# Altium footprint library Relays.PcbLib: 113 footprints (part 1 of 8)
Each footprint in its own frame and in the unit in brackets; x right, y up, seen from the top. Pads: shape width x height; smd on the part's side, far side on the other; paste and mask are expansions set on the pad; w line width, h text height; cw(c..) or ccw(c..) is an arc to the next point about the centre after c.
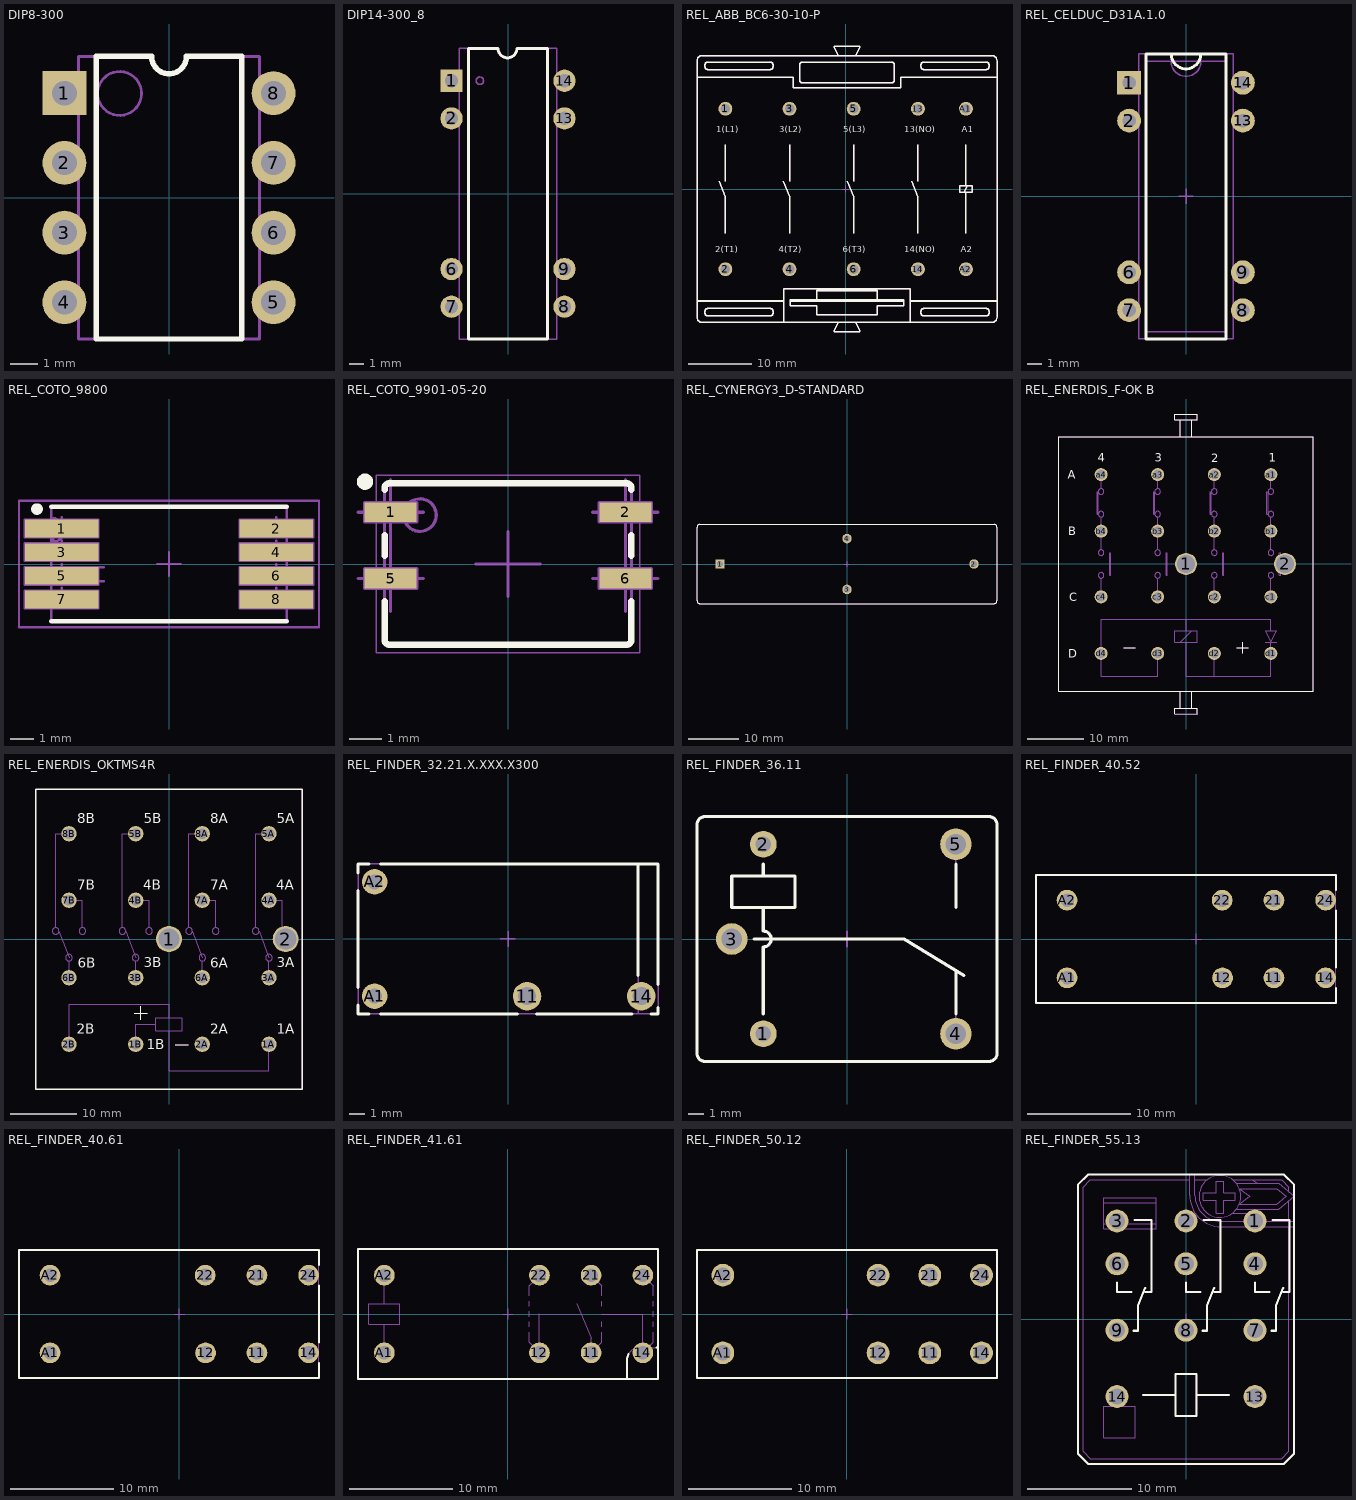
[diagram p0: the footprints below, top view; thin cyan lines are the x and y axes]

## DIP8-300 [mm] "DIP 8 Leads, Row Spacing 7.62 mm; Pitch 2.54 mm"
height 5.08
pads (8):
  rect 1.6x1.6 hole 0.9: 1(-3.81,3.81)
  round 1.6 hole 0.9: 2(-3.81,1.27) 3(-3.81,-1.27) 4(-3.81,-3.81) 5(3.81,-3.81) 6(3.81,-1.27) 7(3.81,1.27) 8(3.81,3.81)
Top Overlay:
  lines w0.2: -2.65,-5.15 2.65,-5.15 2.65,5.15 0.635,5.15 cw(c0,5.15) -0.635,5.15 -2.65,5.15 -2.65,-5.15
Mechanical 14:
  circle w0.1: c-1.8,3.8 r0.8
  lines w0.1: -3.3,-5.15 -3.3,5.15 -0.67,5.15 ccw(c-0.035,5.15) 0.6,5.15 3.3,5.15 3.3,-5.15 -3.3,-5.15
3D body "DIP8-300.stp": height 5.33, standoff -3.3, extent -3.91,-5.03 3.96,5.13

## DIP14-300_8 [mm] "DIP 14 Leads, Row Spacing 7.62 mm; Pitch 2.54 mm"
height 5.08
pads (8):
  rect 1.5x1.5 hole 0.9: 1(-3.81,7.62)
  round 1.5 hole 0.9: 2(-3.81,5.08) 6(-3.81,-5.08) 7(-3.81,-7.62) 8(3.81,-7.62) 9(3.81,-5.08) 13(3.81,5.08) 14(3.81,7.62)
Top Overlay:
  lines w0.2: -0.685,9.8 -2.65,9.8 -2.65,-9.8 2.65,-9.8 2.65,9.8 ; -0.67,9.8 ccw(c-0.035,9.8) 0.6,9.8 2.615,9.8
Mechanical 14:
  circle w0.1: c-1.905,7.62 r0.254
  lines w0.1: -3.3,-9.8 3.3,-9.8 3.3,9.8 0.6,9.8 cw(c-0.035,9.8) -0.67,9.8 -3.3,9.8 -3.3,-9.8
3D body "DIP14-300.stp": height 5.33, standoff -3.3, extent -3.935,-9.845 3.935,9.845

## REL_ABB_BC6-30-10-P [mm] "10 Leads, Body 47.5mm x 45.2mm, ABB BC6 3-pole Contactor"
height 47.7
pads (10):
  round 2.2 hole 1.5: 1(-19.04,12.7) 2(-19.04,-12.7) 3(-8.88,12.7) 4(-8.88,-12.7) 5(1.28,12.7) 6(1.28,-12.7) 13(11.44,12.7) 14(11.44,-12.7) A1(19.04,12.7) A2(19.04,-12.7)
Top Overlay:
  lines w0.2: -23.53,-17.811 -9.78,-17.811 ; -23.53,-17.7 -9.78,-17.7 ; -23.53,17.7 -8.28,17.7 -8.28,16 8.72,16 8.72,17.7 23.97,17.7 ; -20.04,1.25 -19.04,-1.25 -19.04,-7 ; -19.04,1.25 -19.04,7 ; -9.88,1.25 -8.88,-1.25 -8.88,-7 ; -9.78,-21.1 -9.78,-15.8 10.22,-15.8 10.22,-21.1 ; -8.88,1.25 -8.88,7 ; -8.78,-17.811 9.22,-17.811 ; -8.78,-17.529 9.22,-17.529 ; -4.58,-16.107 5.02,-16.107 ; -1.28,-21.1 -1.28,-21.3 -1.78,-22.4 -1.78,-22.6 2.22,-22.6 2.22,-22.4 1.72,-21.3 1.72,-21.1 ; -1.28,21.1 -1.28,21.3 -1.78,22.4 -1.78,22.6 2.22,22.6 2.22,22.4 1.72,21.3 1.72,21.1 ; 0.28,1.25 1.28,-1.25 1.28,-7 ; 1.28,1.25 1.28,7 ; 10.22,-17.811 23.97,-17.811 ; 10.22,-17.7 23.97,-17.7 ; 10.44,1.25 11.44,-1.25 11.44,-7 ; 11.44,1.25 11.44,7 ; 18.79,-0.5 19.29,0.5 ; 19.04,-7 19.04,-0.5 ; 19.04,0.5 19.04,7 ; -23.53,-20.3 ccw(c-22.73,-20.3) -22.73,-21.1 23.17,-21.1 ccw(c23.17,-20.3) 23.97,-20.3 23.97,20.3 ccw(c23.17,20.3) 23.17,21.1 -22.73,21.1 ccw(c-22.73,20.3) -23.53,20.3 -23.53,-20.3 ; -22.28,-19.6 ccw(c-21.78,-19.6) -21.78,-20.1 -11.98,-20.1 ccw(c-11.98,-19.6) -11.48,-19.6 -11.48,-19.4 ccw(c-11.98,-19.4) -11.98,-18.9 -21.78,-18.9 ccw(c-21.78,-19.4) -22.28,-19.4 -22.28,-19.6 ; -22.28,19.4 ccw(c-21.78,19.4) -21.78,18.9 -11.98,18.9 ccw(c-11.98,19.4) -11.48,19.4 -11.48,19.6 ccw(c-11.98,19.6) -11.98,20.1 -21.78,20.1 ccw(c-21.78,19.6) -22.28,19.6 -22.28,19.4 ; -8.78,-18.5 -8.78,-17.5 -4.58,-17.5 -4.58,-16 5.02,-16 5.02,-17.5 9.22,-17.5 9.22,-18.5 5.02,-18.5 5.02,-19.9 -4.58,-19.9 -4.58,-18.5 -8.78,-18.5 ; -7.28,17.3 ccw(c-6.78,17.3) -6.78,16.8 7.22,16.8 ccw(c7.22,17.3) 7.72,17.3 7.72,19.6 ccw(c7.22,19.6) 7.22,20.1 -6.78,20.1 ccw(c-6.78,19.6) -7.28,19.6 -7.28,17.3 ; 11.92,-19.6 ccw(c12.42,-19.6) 12.42,-20.1 22.22,-20.1 ccw(c22.22,-19.6) 22.72,-19.6 22.72,-19.4 ccw(c22.22,-19.4) 22.22,-18.9 12.42,-18.9 ccw(c12.42,-19.4) 11.92,-19.4 11.92,-19.6 ; 11.92,19.4 ccw(c12.42,19.4) 12.42,18.9 22.22,18.9 ccw(c22.22,19.4) 22.72,19.4 22.72,19.6 ccw(c22.22,19.6) 22.22,20.1 12.42,20.1 ccw(c12.42,19.6) 11.92,19.6 11.92,19.4 ; 18.04,-0.5 18.04,0.5 20.04,0.5 20.04,-0.5 18.04,-0.5
  text "6(T3)" at -0.45,-10 h1
  text "4(T2)" at -10.6,-10 h1
  text "2(T1)" at -20.65,-10 h1
  text "1(L1)" at -20.5,9 h1
  text "3(L2)" at -10.5,9 h1
  text "5(L3)" at -0.4,9 h1
  text "14(NO)" at 9.25,-10 h1
  text "13(NO)" at 9.25,9 h1
  text "A2" at 18.25,-10 h1
  text "A1" at 18.4,9 h1
Mechanical 8:
  lines w0.05: -19.54,-12.7 -19.04,-12.7 ; -19.54,12.7 -19.04,12.7 ; -19.04,-13.2 -19.04,-12.7 ; -19.04,-12.2 -19.04,-12.7 ; -19.04,12.2 -19.04,12.7 ; -19.04,13.2 -19.04,12.7 ; -18.54,-12.7 -19.04,-12.7 ; -18.54,12.7 -19.04,12.7 ; -9.38,-12.7 -8.88,-12.7 ; -9.38,12.7 -8.88,12.7 ; -8.88,-13.2 -8.88,-12.7 ; -8.88,-12.2 -8.88,-12.7 ; -8.88,12.2 -8.88,12.7 ; -8.88,13.2 -8.88,12.7 ; -8.38,-12.7 -8.88,-12.7 ; -8.38,12.7 -8.88,12.7 ; -0.5,0 0,0 ; 0,-0.5 0,0 ; 0,0.5 0,0 ; 0.5,0 0,0 ; 0.78,-12.7 1.28,-12.7 ; 0.78,12.7 1.28,12.7 ; 1.28,-13.2 1.28,-12.7 ; 1.28,-12.2 1.28,-12.7 ; 1.28,12.2 1.28,12.7 ; 1.28,13.2 1.28,12.7 ; 1.78,-12.7 1.28,-12.7 ; 1.78,12.7 1.28,12.7 ; 10.94,-12.7 11.44,-12.7 ; 10.94,12.7 11.44,12.7 ; 11.44,-13.2 11.44,-12.7 ; 11.44,-12.2 11.44,-12.7 ; 11.44,12.2 11.44,12.7 ; 11.44,13.2 11.44,12.7 ; 11.94,-12.7 11.44,-12.7 ; 11.94,12.7 11.44,12.7 ; 18.54,-12.7 19.04,-12.7 ; 18.54,12.7 19.04,12.7 ; 19.04,-13.2 19.04,-12.7 ; 19.04,-12.2 19.04,-12.7 ; 19.04,12.2 19.04,12.7 ; 19.04,13.2 19.04,12.7 ; 19.54,-12.7 19.04,-12.7 ; 19.54,12.7 19.04,12.7
Mechanical 14:
  lines w0.1: -23.53,-17.811 -9.78,-17.811 ; -23.53,-17.7 -9.78,-17.7 ; -23.53,17.7 -8.28,17.7 -8.28,16 8.72,16 8.72,17.7 23.97,17.7 ; -20.04,1.25 -19.04,-1.25 -19.04,-7 ; -19.04,1.25 -19.04,7 ; -9.88,1.25 -8.88,-1.25 -8.88,-7 ; -9.78,-21.1 -9.78,-15.8 10.22,-15.8 10.22,-21.1 ; -8.88,1.25 -8.88,7 ; -8.78,-17.811 9.22,-17.811 ; -8.78,-17.529 9.22,-17.529 ; -4.58,-16.107 5.02,-16.107 ; -1.28,-21.1 -1.28,-21.3 -1.78,-22.4 -1.78,-22.6 2.22,-22.6 2.22,-22.4 1.72,-21.3 1.72,-21.1 ; -1.28,21.1 -1.28,21.3 -1.78,22.4 -1.78,22.6 2.22,22.6 2.22,22.4 1.72,21.3 1.72,21.1 ; 0.28,1.25 1.28,-1.25 1.28,-7 ; 1.28,1.25 1.28,7 ; 10.22,-17.811 23.97,-17.811 ; 10.22,-17.7 23.97,-17.7 ; 10.44,1.25 11.44,-1.25 11.44,-7 ; 11.44,1.25 11.44,7 ; 18.79,-0.5 19.29,0.5 ; 19.04,-7 19.04,-0.5 ; 19.04,0.5 19.04,7 ; -23.53,-20.3 ccw(c-22.73,-20.3) -22.73,-21.1 23.17,-21.1 ccw(c23.17,-20.3) 23.97,-20.3 23.97,20.3 ccw(c23.17,20.3) 23.17,21.1 -22.73,21.1 ccw(c-22.73,20.3) -23.53,20.3 -23.53,-20.3 ; -22.28,-19.6 ccw(c-21.78,-19.6) -21.78,-20.1 -11.98,-20.1 ccw(c-11.98,-19.6) -11.48,-19.6 -11.48,-19.4 ccw(c-11.98,-19.4) -11.98,-18.9 -21.78,-18.9 ccw(c-21.78,-19.4) -22.28,-19.4 -22.28,-19.6 ; -22.28,19.4 ccw(c-21.78,19.4) -21.78,18.9 -11.98,18.9 ccw(c-11.98,19.4) -11.48,19.4 -11.48,19.6 ccw(c-11.98,19.6) -11.98,20.1 -21.78,20.1 ccw(c-21.78,19.6) -22.28,19.6 -22.28,19.4 ; -8.78,-18.5 -8.78,-17.5 -4.58,-17.5 -4.58,-16 5.02,-16 5.02,-17.5 9.22,-17.5 9.22,-18.5 5.02,-18.5 5.02,-19.9 -4.58,-19.9 -4.58,-18.5 -8.78,-18.5 ; -7.28,17.3 ccw(c-6.78,17.3) -6.78,16.8 7.22,16.8 ccw(c7.22,17.3) 7.72,17.3 7.72,19.6 ccw(c7.22,19.6) 7.22,20.1 -6.78,20.1 ccw(c-6.78,19.6) -7.28,19.6 -7.28,17.3 ; 11.92,-19.6 ccw(c12.42,-19.6) 12.42,-20.1 22.22,-20.1 ccw(c22.22,-19.6) 22.72,-19.6 22.72,-19.4 ccw(c22.22,-19.4) 22.22,-18.9 12.42,-18.9 ccw(c12.42,-19.4) 11.92,-19.4 11.92,-19.6 ; 11.92,19.4 ccw(c12.42,19.4) 12.42,18.9 22.22,18.9 ccw(c22.22,19.4) 22.72,19.4 22.72,19.6 ccw(c22.22,19.6) 22.22,20.1 12.42,20.1 ccw(c12.42,19.6) 11.92,19.6 11.92,19.4 ; 18.04,-0.5 20.04,-0.5 20.04,0.5 18.04,0.5 18.04,-0.5
3D body "REL_ABB_BC6-30-10-P.stp": height 47.7, standoff -4.3, extent -23.53,-22.6 23.971,22.6

## REL_CELDUC_D31A.1.0 [mm] "DIP 14 - 8 Leads, Row Spacing 7.62 mm; Pitch 2.54 mm"
height 6.8
pads (8):
  rect 1.6x1.6 hole 0.9: 1(-3.81,7.62)
  round 1.6 hole 0.9: 2(-3.81,5.08) 6(-3.81,-5.08) 7(-3.81,-7.62) 8(3.81,-7.62) 9(3.81,-5.08) 13(3.81,5.08) 14(3.81,7.62)
Top Overlay:
  lines w0.2: -0.999,9.55 ccw(c0,9.55) 0.999,9.55 ; -2.675,-9.55 -2.675,9.55 2.675,9.55 2.675,-9.55 -2.675,-9.55
Mechanical 8:
  lines w0.1: -4.31,-7.62 -3.81,-7.62 ; -4.31,-5.08 -3.81,-5.08 ; -4.31,5.08 -3.81,5.08 ; -4.31,7.62 -3.81,7.62 ; -3.81,-8.12 -3.81,-7.62 ; -3.81,-7.12 -3.81,-7.62 ; -3.81,-5.58 -3.81,-5.08 ; -3.81,-4.58 -3.81,-5.08 ; -3.81,4.58 -3.81,5.08 ; -3.81,5.58 -3.81,5.08 ; -3.81,7.12 -3.81,7.62 ; -3.81,8.12 -3.81,7.62 ; -3.31,-7.62 -3.81,-7.62 ; -3.31,-5.08 -3.81,-5.08 ; -3.31,5.08 -3.81,5.08 ; -3.31,7.62 -3.81,7.62 ; -0.5,0 0,0 ; 0,-0.5 0,0 ; 0,0.5 0,0 ; 0.5,0 0,0 ; 3.31,-7.62 3.81,-7.62 ; 3.31,-5.08 3.81,-5.08 ; 3.31,5.08 3.81,5.08 ; 3.31,7.62 3.81,7.62 ; 3.81,-8.12 3.81,-7.62 ; 3.81,-7.12 3.81,-7.62 ; 3.81,-5.58 3.81,-5.08 ; 3.81,-4.58 3.81,-5.08 ; 3.81,4.58 3.81,5.08 ; 3.81,5.58 3.81,5.08 ; 3.81,7.12 3.81,7.62 ; 3.81,8.12 3.81,7.62 ; 4.31,-7.62 3.81,-7.62 ; 4.31,-5.08 3.81,-5.08 ; 4.31,5.08 3.81,5.08 ; 4.31,7.62 3.81,7.62
Mechanical 14:
  lines w0.1: -0.999,9.05 ccw(c0,9.05) 0.999,9.05 ; -3.175,-9.55 -3.175,9.55 3.175,9.55 3.175,-9.55 -3.175,-9.55 ; -2.675,-9.05 -2.675,9.05 2.675,9.05 2.675,-9.05 -2.675,-9.05
3D body "REL_CELDUC_D31A.1.0.stp": height 7.33, standoff -3.3, extent -3.935,-9.551 3.935,9.551

## REL_COTO_9800 [mm] "9800 Serie SMD Reed Relay,  J-Lead Style, COTO 9814 & 9852 Model"
height 5.08
pads (8):
  rect 3.175x0.76 smd: 1(-4.633,1.53) 2(4.633,1.53) 3(-4.633,0.51) 4(4.633,0.51) 5(-4.633,-0.51) 6(4.633,-0.51) 7(-4.633,-1.53) 8(4.633,-1.53)
Top Overlay:
  circle w0.25: c-5.693,2.37 r0.125
  lines w0.2: -5.08,-2.475 5.08,-2.475 ; -5.08,2.475 5.08,2.475
Mechanical 8:
  lines w0.1: -5.133,-1.53 -4.633,-1.53 ; -5.133,-0.51 -4.633,-0.51 ; -5.133,0.51 -4.633,0.51 ; -5.133,1.53 -4.633,1.53 ; -4.633,-1.03 -4.633,-1.53 ; -4.633,-0.01 -4.633,-0.51 ; -4.633,1.01 -4.633,0.51 ; -4.633,2.03 -4.633,1.53 ; -4.4,-0.745 -2.8,-0.745 ; -4.4,-0.145 -2.8,-0.145 ; -4.133,-1.53 -4.633,-1.53 ; -4.133,-0.51 -4.633,-0.51 ; -4.133,0.51 -4.633,0.51 ; -4.133,1.53 -4.633,1.53 ; -0.5,0 0,0 ; 0,-0.5 0,0 ; 0,0.5 0,0 ; 0.5,0 0,0 ; 4.133,-1.53 4.633,-1.53 ; 4.133,-0.51 4.633,-0.51 ; 4.133,0.51 4.633,0.51 ; 4.133,1.53 4.633,1.53 ; 4.633,-1.03 4.633,-1.53 ; 4.633,-0.01 4.633,-0.51 ; 4.633,1.01 4.633,0.51 ; 4.633,2.03 4.633,1.53 ; 5.133,-1.53 4.633,-1.53 ; 5.133,-0.51 4.633,-0.51 ; 5.133,0.51 4.633,0.51 ; 5.133,1.53 4.633,1.53 ; -6.22,-1.91 -3.045,-1.91 -3.045,-1.15 -6.22,-1.15 -6.22,-1.91 ; -6.22,-0.89 -3.045,-0.89 -3.045,-0.13 -6.22,-0.13 -6.22,-0.89 ; -6.22,0.13 -3.045,0.13 -3.045,0.89 -6.22,0.89 -6.22,0.13 ; -6.22,1.15 -3.045,1.15 -3.045,1.91 -6.22,1.91 -6.22,1.15 ; 3.045,-1.91 6.22,-1.91 6.22,-1.15 3.045,-1.15 3.045,-1.91 ; 3.045,-0.89 6.22,-0.89 6.22,-0.13 3.045,-0.13 3.045,-0.89 ; 3.045,0.13 6.22,0.13 6.22,0.89 3.045,0.89 3.045,0.13 ; 3.045,1.15 6.22,1.15 6.22,1.91 3.045,1.91 3.045,1.15
Mechanical 14:
  lines w0.1: -5.08,-1.72 -5.585,-1.72 -5.585,-1.34 -5.08,-1.34 ; -5.08,-0.7 -5.585,-0.7 -5.585,-0.32 -5.08,-0.32 ; -5.08,0.32 -5.585,0.32 -5.585,0.7 -5.08,0.7 ; -5.08,1.34 -5.585,1.34 -5.585,1.72 -5.08,1.72 ; 5.08,-1.72 5.585,-1.72 5.585,-1.34 5.08,-1.34 ; 5.08,-0.7 5.585,-0.7 5.585,-0.32 5.08,-0.32 ; 5.08,0.32 5.585,0.32 5.585,0.7 5.08,0.7 ; 5.08,1.34 5.585,1.34 5.585,1.72 5.08,1.72 ; -5.08,-2.475 -5.08,2.475 ; -5.08,-2.475 5.08,-2.475 5.08,2.475 -5.08,2.475 ; -5.08,-2.475 -5.08,2.475 ; -4.98,0.975 ccw(c-4.98,1.475) -4.98,1.975 ; -4.98,0.975 ccw(c-4.98,1.475) -4.98,1.975 ; -4.98,0.975 -4.98,1.975
Mechanical 15:
  lines w0.1: -6.47,-2.725 6.47,-2.725 6.47,2.725 -6.47,2.725 -6.47,-2.725
3D body "REL_COTO_9800.stp": height 5.08, standoff 0, extent -5.585,-2.475 5.585,2.475

## REL_COTO_9901-05-20 [mm] "SMD Reed Relay,  J-Lead Style, COTO 9900 Series"
height 3.6
pads (4):
  rect 1.6x0.6 smd: 1(-3.6,1.585) 2(3.6,1.585) 5(-3.6,-0.445) 6(3.6,-0.445)
Top Overlay:
  circle w0.25: c-4.385,2.525 r0.125
  lines w0.2: -3.785,-1.145 -3.785,-2.324 ccw(c-3.635,-2.324) -3.635,-2.474 3.635,-2.474 ccw(c3.635,-2.324) 3.785,-2.324 3.785,-1.145 ; -3.785,0.255 -3.785,0.885 ; -3.785,2.285 -3.785,2.325 cw(c-3.635,2.325) -3.635,2.475 3.635,2.475 cw(c3.635,2.325) 3.785,2.325 3.785,2.285 ; 3.785,0.255 3.785,0.885
Mechanical 8:
  lines w0.1: -4.6,-0.445 -3.6,-0.445 ; -4.6,1.585 -3.6,1.585 ; -3.6,-1.445 -3.6,-0.445 ; -3.6,0.555 -3.6,-0.445 ; -3.6,0.585 -3.6,1.585 ; -3.6,2.585 -3.6,1.585 ; -2.6,-0.445 -3.6,-0.445 ; -2.6,1.585 -3.6,1.585 ; -1,0 0,0 ; 0,-1 0,0 ; 0,1 0,0 ; 1,0 0,0 ; 2.6,-0.445 3.6,-0.445 ; 2.6,1.585 3.6,1.585 ; 3.6,-1.445 3.6,-0.445 ; 3.6,0.555 3.6,-0.445 ; 3.6,0.585 3.6,1.585 ; 3.6,2.585 3.6,1.585 ; 4.6,-0.445 3.6,-0.445 ; 4.6,1.585 3.6,1.585 ; -4.4,-0.745 -4.4,-0.145 -2.8,-0.145 -2.8,-0.745 -4.4,-0.745 ; -4.4,1.285 -2.8,1.285 -2.8,1.885 -4.4,1.885 -4.4,1.285 ; 2.8,-0.745 2.8,-0.145 4.4,-0.145 4.4,-0.745 2.8,-0.745 ; 2.8,1.285 4.4,1.285 4.4,1.885 2.8,1.885 2.8,1.285
Mechanical 14:
  circle w0.1: c-2.7,1.5 r0.5
  lines w0.1: -3.79,-0.255 -3.97,-0.255 -3.97,-0.635 -3.785,-0.635 ; -3.79,1.775 -3.97,1.775 -3.97,1.395 -3.785,1.395 ; 3.785,1.775 3.97,1.775 3.97,1.395 3.79,1.395 ; 3.79,-0.635 3.97,-0.635 3.97,-0.255 3.79,-0.255 ; -3.785,-2.324 ccw(c-3.635,-2.324) -3.635,-2.474 3.635,-2.474 ccw(c3.635,-2.324) 3.785,-2.324 3.785,2.325 ccw(c3.635,2.325) 3.635,2.475 -3.635,2.475 ccw(c-3.635,2.325) -3.785,2.325 -3.785,-2.324
Mechanical 15:
  lines w0.05: -4.035,-2.724 -4.035,2.725 4.035,2.725 4.035,-2.724 -4.035,-2.724
3D body "REL_COTO_9901-05-20.stp": height 3.6, standoff 0, extent -3.97,-2.475 3.97,2.475

## REL_CYNERGY3_D-STANDARD [mm] "4 Leads, Body 60mm x 15.8mm, CYNERGY3  D Series, Standard Mounting Style"
height 18.5
pads (4):
  rect 1.9x1.9 hole 1.2: 1(-25.4,0)
  round 1.9 hole 1.2: 2(25.4,0) 3(0,-5.08) 4(0,5.08)
Top Overlay:
  lines w0.2: -30,-7.4 ccw(c-29.5,-7.4) -29.5,-7.9 29.5,-7.9 ccw(c29.5,-7.4) 30,-7.4 30,7.4 ccw(c29.5,7.4) 29.5,7.9 -29.5,7.9 ccw(c-29.5,7.4) -30,7.4 -30,-7.4
Mechanical 8:
  lines w0.1: -25.9,0 -25.4,0 ; -25.4,-0.5 -25.4,0 ; -25.4,0.5 -25.4,0 ; -24.9,0 -25.4,0 ; -0.5,-5.08 0,-5.08 ; -0.5,0 0,0 ; -0.5,5.08 0,5.08 ; 0,-5.58 0,-5.08 ; 0,-4.58 0,-5.08 ; 0,-0.5 0,0 ; 0,0.5 0,0 ; 0,4.58 0,5.08 ; 0,5.58 0,5.08 ; 0.5,-5.08 0,-5.08 ; 0.5,0 0,0 ; 0.5,5.08 0,5.08 ; 24.9,0 25.4,0 ; 25.4,-0.5 25.4,0 ; 25.4,0.5 25.4,0 ; 25.9,0 25.4,0
Mechanical 14:
  lines w0.1: -30,-7.4 ccw(c-29.5,-7.4) -29.5,-7.9 29.5,-7.9 ccw(c29.5,-7.4) 30,-7.4 30,7.4 ccw(c29.5,7.4) 29.5,7.9 -29.5,7.9 ccw(c-29.5,7.4) -30,7.4 -30,-7.4
3D body "REL_CYNERGY3_D-STANDARD.stp": height 18.5, standoff -4, extent -30,-7.9 30,7.9

## REL_ENERDIS_F-OK B [mm] "16 Leads, Row Spacing 10mm; Body 45mm x 53mm, 4 x DPDT Relay, ENERDIS F-OK Series"
height 105
pads (18):
  round 3.9 hole 3.2: 1(0,0) 2(17.5,0)
  round 2.3 hole 1.6: a1(15,15.8) a2(5,15.8) a3(-5,15.8) a4(-15,15.8) b1(15,5.8) b2(5,5.8) b3(-5,5.8) b4(-15,5.8) c1(15,-5.8) c2(5,-5.8) c3(-5,-5.8) c4(-15,-5.8) d1(15,-15.8) d2(5,-15.8) d3(-5,-15.8) d4(-15,-15.8)
Top Overlay:
  lines w0.1: -11,-14.8 -9,-14.8 ; 9,-14.8 11,-14.8 ; 10,-15.8 10,-13.8
  lines w0.2: -1,-25.5 -1,-22.5 ; -1,22.5 -1,25.5 ; 1,-25.5 1,-22.5 ; 1,22.5 1,25.5 ; -22.5,-22.5 22.5,-22.5 22.5,22.5 -22.5,22.5 -22.5,-22.5 ; -2,-26.5 -2,-25.5 2,-25.5 2,-26.5 -2,-26.5 ; -2,25.5 -2,26.5 2,26.5 2,25.5 -2,25.5
  text "D" at -20.818,-16.55 h1.5
  text "C" at -20.665,-6.55 h1.5
  text "B" at -20.775,5.05 h1.5
  text "A" at -20.85,15.05 h1.5
  text "4" at -15.6,18.05 h1.5
  text "3" at -5.556,18.081 h1.5
  text "2" at 4.449,18.012 h1.5
  text "1" at 14.625,18.05 h1.5
Mechanical 8:
  lines w0.1: -15.5,-15.8 -15,-15.8 ; -15.5,-5.8 -15,-5.8 ; -15.5,5.8 -15,5.8 ; -15.5,15.8 -15,15.8 ; -15,-16.3 -15,-15.8 ; -15,-15.3 -15,-15.8 ; -15,-6.3 -15,-5.8 ; -15,-5.3 -15,-5.8 ; -15,5.3 -15,5.8 ; -15,6.3 -15,5.8 ; -15,15.3 -15,15.8 ; -15,16.3 -15,15.8 ; -14.5,-15.8 -15,-15.8 ; -14.5,-5.8 -15,-5.8 ; -14.5,5.8 -15,5.8 ; -14.5,15.8 -15,15.8 ; -5.5,-15.8 -5,-15.8 ; -5.5,-5.8 -5,-5.8 ; -5.5,5.8 -5,5.8 ; -5.5,15.8 -5,15.8 ; -5,-16.3 -5,-15.8 ; -5,-15.3 -5,-15.8 ; -5,-6.3 -5,-5.8 ; -5,-5.3 -5,-5.8 ; -5,5.3 -5,5.8 ; -5,6.3 -5,5.8 ; -5,15.3 -5,15.8 ; -5,16.3 -5,15.8 ; -4.5,-15.8 -5,-15.8 ; -4.5,-5.8 -5,-5.8 ; -4.5,5.8 -5,5.8 ; -4.5,15.8 -5,15.8 ; -0.5,0 0,0 ; 0,-0.5 0,0 ; 0,0.5 0,0 ; 0.5,0 0,0 ; 4.5,-15.8 5,-15.8 ; 4.5,-5.8 5,-5.8 ; 4.5,5.8 5,5.8 ; 4.5,15.8 5,15.8 ; 5,-16.3 5,-15.8 ; 5,-15.3 5,-15.8 ; 5,-6.3 5,-5.8 ; 5,-5.3 5,-5.8 ; 5,5.3 5,5.8 ; 5,6.3 5,5.8 ; 5,15.3 5,15.8 ; 5,16.3 5,15.8 ; 5.5,-15.8 5,-15.8 ; 5.5,-5.8 5,-5.8 ; 5.5,5.8 5,5.8 ; 5.5,15.8 5,15.8 ; 14.5,-15.8 15,-15.8 ; 14.5,-5.8 15,-5.8 ; 14.5,5.8 15,5.8 ; 14.5,15.8 15,15.8 ; 15,-16.3 15,-15.8 ; 15,-15.3 15,-15.8 ; 15,-6.3 15,-5.8 ; 15,-5.3 15,-5.8 ; 15,5.3 15,5.8 ; 15,6.3 15,5.8 ; 15,15.3 15,15.8 ; 15,16.3 15,15.8 ; 15.5,-15.8 15,-15.8 ; 15.5,-5.8 15,-5.8 ; 15.5,5.8 15,5.8 ; 15.5,15.8 15,15.8
  text "C1" at 14.135,-8.55 h1.5
  text "C2" at 3.94,-8.553 h1.5
  text "C3" at -6.046,-8.55 h1.5
  text "C4" at -16.09,-8.55 h1.5
  text "A1" at 13.95,13.05 h1.5
  text "A2" at 3.755,13.012 h1.5
  text "A3" at -6.231,13.081 h1.5
  text "A4" at -16.275,13.05 h1.5
  text "D4" at -16.2,-18.55 h1.5
  text "D3" at -6.156,-18.55 h1.5
  text "D2" at 3.83,-18.55 h1.5
  text "D1" at 14.025,-18.55 h1.5
  text "B4" at -16.2,3.05 h1.5
  text "B3" at -6.156,3.081 h1.5
  text "B2" at 3.83,3.012 h1.5
  text "B1" at 14.025,3.05 h1.5
  text "Use with Socket ENERDIS 65F-P01400153A" at -16.575,-11.75 h1.2
Mechanical 14:
  circle w0.1: c-15,2 r0.5
  circle w0.1: c-15,-2 r0.5
  circle w0.1: c-15,12.8 r0.5
  circle w0.1: c-15,8.8 r0.5
  circle w0.1: c-5,2 r0.5
  circle w0.1: c-5,-2 r0.5
  circle w0.1: c-5,12.8 r0.5
  circle w0.1: c-5,8.8 r0.5
  circle w0.1: c5,2 r0.5
  circle w0.1: c5,-2 r0.5
  circle w0.1: c5,12.8 r0.5
  circle w0.1: c5,8.8 r0.5
  circle w0.1: c15,2 r0.5
  circle w0.1: c15,-2 r0.5
  circle w0.1: c15,12.8 r0.5
  circle w0.1: c15,8.8 r0.5
  lines w0.1: -15,-5.8 -15,-2.5 ; -15,2.5 -15,5.8 -15,8.3 ; -15,13.3 -15,15.8 ; -11,-14.8 -9,-14.8 ; -5,-15.8 -5,-19.8 -15,-19.8 -15,-15.8 -15,-9.8 15,-9.8 15,-11.8 ; -5,-5.8 -5,-2.5 ; -5,2.5 -5,5.8 -5,8.3 ; -5,13.3 -5,15.8 ; -1,-25.5 -1,-22.5 ; -1,-13.8 1,-11.8 ; -1,22.5 -1,25.5 ; 0,-13.8 0,-19.8 15,-19.8 15,-15.8 15,-13.8 ; 0,-11.8 0,-9.8 ; 1,-25.5 1,-22.5 ; 1,22.5 1,25.5 ; 5,-19.8 5,-15.8 ; 5,-5.8 5,-2.5 ; 5,2.5 5,5.8 5,8.3 ; 5,13.3 5,15.8 ; 9,-14.8 11,-14.8 ; 10,-15.8 10,-13.8 ; 14,-13.8 16,-13.8 ; 15,-5.8 15,-2.5 ; 15,2.5 15,5.8 15,8.3 ; 15,13.3 15,15.8 ; 15,-13.8 14,-11.8 16,-11.8 15,-13.8 ; -22.5,-22.5 22.5,-22.5 22.5,22.5 -22.5,22.5 -22.5,-22.5 ; -15.7,8.8 -15.7,12.8 -15.5,12.8 -15.5,8.8 -15.7,8.8 ; -13.5,-2 -13.5,2 -13.3,2 -13.3,-2 -13.5,-2 ; -5.7,8.8 -5.7,12.8 -5.5,12.8 -5.5,8.8 -5.7,8.8 ; -3.5,-2 -3.5,2 -3.3,2 -3.3,-2 -3.5,-2 ; -2,-26.5 -2,-25.5 2,-25.5 2,-26.5 -2,-26.5 ; -2,-13.8 -2,-11.8 2,-11.8 2,-13.8 -2,-13.8 ; -2,25.5 -2,26.5 2,26.5 2,25.5 -2,25.5 ; 4.3,8.8 4.3,12.8 4.5,12.8 4.5,8.8 4.3,8.8 ; 6.5,-2 6.5,2 6.7,2 6.7,-2 6.5,-2 ; 14.3,8.8 14.3,12.8 14.5,12.8 14.5,8.8 14.3,8.8 ; 16.5,-2 16.5,2 16.7,2 16.7,-2 16.5,-2
  text "D" at -20.818,-16.55 h1.5
  text "C" at -20.665,-6.55 h1.5
  text "B" at -20.775,5.05 h1.5
  text "A" at -20.85,15.05 h1.5
  text "4" at -15.6,18.05 h1.5
  text "3" at -5.556,18.081 h1.5
  text "2" at 4.449,18.012 h1.5
  text "1" at 14.625,18.05 h1.5
3D body "REL_ENERDIS_F-OK B.stp": height 126.5, standoff 13.5, extent -22.5,-26.5 22.5,26.5

## REL_ENERDIS_OKTMS4R [mm] "16 Leads, Row Spacing 10mm; Body 45mm x 53mm, 4 x DPDT Relay, ENERDIS F-OK Series"
height 97
pads (18):
  round 3.9 hole 3.2: 1(0,0) 2(17.5,0)
  round 2.3 hole 1.6: 1A(15,-15.8) 1B(-5,-15.8) 2A(5,-15.8) 2B(-15,-15.8) 3A(15,-5.8) 3B(-5,-5.8) 4A(15,5.8) 4B(-5,5.8) 5A(15,15.8) 5B(-5,15.8) 6A(5,-5.8) 6B(-15,-5.8) 7A(5,5.8) 7B(-15,5.8) 8A(5,15.8) 8B(-15,15.8)
Top Overlay:
  lines w0.1: -5.227,-11.115 -3.227,-11.115 ; -4.227,-12.115 -4.227,-10.115 ; 0.917,-15.871 2.917,-15.871
  lines w0.2: -20,-22.5 -20,22.5 20,22.5 20,-22.5 -20,-22.5
  text "2B" at -13.825,-14.219 h1.5
  text "2A" at 6.175,-14.219 h1.5
  text "1A" at 16.175,-14.219 h1.5
  text "1B" at -3.325,-16.575 h1.5
  text "3A" at 16.175,-4.219 h1.5
  text "6A" at 6.22,-4.284 h1.5
  text "3B" at -3.75,-4.219 h1.5
  text "6B" at -13.705,-4.284 h1.5
  text "4A" at 16.1,7.35 h1.5
  text "7A" at 6.175,7.35 h1.5
  text "4B" at -3.825,7.35 h1.5
  text "7B" at -13.75,7.35 h1.5
  text "5A" at 16.175,17.381 h1.5
  text "8A" at 6.175,17.35 h1.5
  text "5B" at -3.75,17.381 h1.5
  text "8B" at -13.75,17.35 h1.5
Mechanical 8:
  lines w0.1: -15.5,-15.8 -15,-15.8 ; -15.5,-5.8 -15,-5.8 ; -15.5,5.8 -15,5.8 ; -15.5,15.8 -15,15.8 ; -15,-16.3 -15,-15.8 ; -15,-15.3 -15,-15.8 ; -15,-6.3 -15,-5.8 ; -15,-5.3 -15,-5.8 ; -15,5.3 -15,5.8 ; -15,6.3 -15,5.8 ; -15,15.3 -15,15.8 ; -15,16.3 -15,15.8 ; -14.5,-15.8 -15,-15.8 ; -14.5,-5.8 -15,-5.8 ; -14.5,5.8 -15,5.8 ; -14.5,15.8 -15,15.8 ; -5.5,-15.8 -5,-15.8 ; -5.5,-5.8 -5,-5.8 ; -5.5,5.8 -5,5.8 ; -5.5,15.8 -5,15.8 ; -5,-16.3 -5,-15.8 ; -5,-15.3 -5,-15.8 ; -5,-6.3 -5,-5.8 ; -5,-5.3 -5,-5.8 ; -5,5.3 -5,5.8 ; -5,6.3 -5,5.8 ; -5,15.3 -5,15.8 ; -5,16.3 -5,15.8 ; -4.5,-15.8 -5,-15.8 ; -4.5,-5.8 -5,-5.8 ; -4.5,5.8 -5,5.8 ; -4.5,15.8 -5,15.8 ; -0.5,0 0,0 ; 0,-0.5 0,0 ; 0,0.5 0,0 ; 0.5,0 0,0 ; 4.5,-15.8 5,-15.8 ; 4.5,-5.8 5,-5.8 ; 4.5,5.8 5,5.8 ; 4.5,15.8 5,15.8 ; 5,-16.3 5,-15.8 ; 5,-15.3 5,-15.8 ; 5,-6.3 5,-5.8 ; 5,-5.3 5,-5.8 ; 5,5.3 5,5.8 ; 5,6.3 5,5.8 ; 5,15.3 5,15.8 ; 5,16.3 5,15.8 ; 5.5,-15.8 5,-15.8 ; 5.5,-5.8 5,-5.8 ; 5.5,5.8 5,5.8 ; 5.5,15.8 5,15.8 ; 14.5,-15.8 15,-15.8 ; 14.5,-5.8 15,-5.8 ; 14.5,5.8 15,5.8 ; 14.5,15.8 15,15.8 ; 15,-16.3 15,-15.8 ; 15,-15.3 15,-15.8 ; 15,-6.3 15,-5.8 ; 15,-5.3 15,-5.8 ; 15,5.3 15,5.8 ; 15,6.3 15,5.8 ; 15,15.3 15,15.8 ; 15,16.3 15,15.8 ; 15.5,-15.8 15,-15.8 ; 15.5,-5.8 15,-5.8 ; 15.5,5.8 15,5.8 ; 15.5,15.8 15,15.8
  text "Use with Socket ENERDIS 65F-P01400153A" at -16.575,-11.75 h1.2
Mechanical 14:
  circle w0.1: c-13,1.2 r0.5
  circle w0.1: c-17,1.2 r0.5
  circle w0.1: c-15,-2.8 r0.5
  circle w0.1: c-3,1.2 r0.5
  circle w0.1: c-7,1.2 r0.5
  circle w0.1: c-5,-2.8 r0.5
  circle w0.1: c7,1.2 r0.5
  circle w0.1: c3,1.2 r0.5
  circle w0.1: c5,-2.8 r0.5
  circle w0.1: c17,1.2 r0.5
  circle w0.1: c13,1.2 r0.5
  circle w0.1: c15,-2.8 r0.5
  lines w0.1: -17,1.7 -17,15.8 -15,15.8 ; -16.5,1.2 -15,-2.8 ; -15,-15.8 -15,-9.8 0,-9.8 0,-11.8 ; -15,-5.8 -15,-3.3 ; -15,5.8 -13,5.8 -13,1.7 ; -7,1.7 -7,15.8 -5,15.8 ; -6.5,1.2 -5,-2.8 ; -5.227,-11.115 -3.227,-11.115 ; -5,-15.8 -5,-12.8 -2,-12.8 ; -5,-5.8 -5,-3.3 ; -5,5.8 -3,5.8 -3,1.7 ; -4.227,-12.115 -4.227,-10.115 ; 0,-13.8 0,-19.8 15,-19.8 15,-15.8 ; 0.917,-15.871 2.917,-15.871 ; 3,1.7 3,15.8 5,15.8 ; 3.5,1.2 5,-2.8 ; 5,-5.8 5,-3.3 ; 5,5.8 7,5.8 7,1.7 ; 13,1.7 13,15.8 15,15.8 ; 13.5,1.2 15,-2.8 ; 15,-5.8 15,-3.3 ; 15,5.8 17,5.8 17,1.7 ; -20,-22.5 -20,22.5 20,22.5 20,-22.5 -20,-22.5 ; -2,-13.8 2,-13.8 2,-11.8 -2,-11.8 -2,-13.8
  text "2B" at -13.825,-14.219 h1.5
  text "2A" at 6.175,-14.219 h1.5
  text "1A" at 16.175,-14.219 h1.5
  text "1B" at -3.325,-16.575 h1.5
  text "3A" at 16.175,-4.219 h1.5
  text "6A" at 6.22,-4.284 h1.5
  text "3B" at -3.75,-4.219 h1.5
  text "6B" at -13.705,-4.284 h1.5
  text "4A" at 16.1,7.35 h1.5
  text "7A" at 6.175,7.35 h1.5
  text "4B" at -3.825,7.35 h1.5
  text "7B" at -13.75,7.35 h1.5
  text "5A" at 16.175,17.381 h1.5
  text "8A" at 6.175,17.35 h1.5
  text "5B" at -3.75,17.381 h1.5
  text "8B" at -13.75,17.35 h1.5
3D body "REL_ENERDIS_OKTMS4R.stp": height 118.5, standoff 13.5, extent -20,-22.5 20,22.5

## REL_FINDER_32.21.X.XXX.X300 [mm] "1 NO (SPST-NO) 32 Series Subminiature PCB Relay, Body 20mm x 10mm"
height 10.7
pads (4):
  round 1.9 hole 1.2: 11(1.27,-3.81) 14(8.89,-3.81)
  round 1.7 hole 1: A1(-8.89,-3.81) A2(-8.89,3.81)
Top Overlay:
  lines w0.2: -10,-4.385 -10,-5 -9.273,-5 ; -10,-3.235 -10,3.235 ; -10,4.385 -10,5 -9.273,5 ; -8.507,-5 0.633,-5 ; -8.507,5 10,5 10,-3.042 ; 1.907,-5 8.253,-5 ; 8.675,-2.45 8.675,5 ; 9.527,-5 10,-5 10,-4.578
Mechanical 8:
  lines w0.1: -9.39,-3.81 -8.89,-3.81 ; -9.39,3.81 -8.89,3.81 ; -8.89,-4.31 -8.89,-3.81 ; -8.89,-3.31 -8.89,-3.81 ; -8.89,3.31 -8.89,3.81 ; -8.89,4.31 -8.89,3.81 ; -8.39,-3.81 -8.89,-3.81 ; -8.39,3.81 -8.89,3.81 ; -0.5,0 0,0 ; 0,-0.5 0,0 ; 0,0.5 0,0 ; 0.5,0 0,0 ; 0.77,-3.81 1.27,-3.81 ; 1.27,-4.31 1.27,-3.81 ; 1.27,-3.31 1.27,-3.81 ; 1.77,-3.81 1.27,-3.81 ; 8.39,-3.81 8.89,-3.81 ; 8.89,-4.31 8.89,-3.81 ; 8.89,-3.31 8.89,-3.81 ; 9.39,-3.81 8.89,-3.81
Mechanical 14:
  lines w0.1: 8.675,-5 8.675,5 ; -10,-5 10,-5 10,5 -10,5 -10,-5
3D body "REL_FINDER_32.21.X.XXX.X300.stp": height 10.7, standoff -3.6, extent -10,-5 10,5

## REL_FINDER_36.11 [mm] "5 Leads, Row Spacing 12 mm; Body 19mm x 15.5mm, 36 Series"
height 15.5
pads (5):
  round 1.7 hole 1: 1(-5.3,-6) 2(-5.3,6)
  round 2 hole 1.3: 3(-7.3,0) 4(6.9,-6) 5(6.9,6)
Top Overlay:
  lines w0.2: -5.9,0 3.6,0 7.4,-2.303 ; -5.3,-4.75 -5.3,-0.5 ccw(c-5.3,0) -5.3,0.5 -5.3,2 ; -5.3,4 -5.3,4.75 ; 6.9,-4.75 6.9,-2 ; 6.9,2 6.9,4.75 ; -9.5,-7.25 ccw(c-9,-7.25) -9,-7.75 9,-7.75 ccw(c9,-7.25) 9.5,-7.25 9.5,7.25 ccw(c9,7.25) 9,7.75 -9,7.75 ccw(c-9,7.25) -9.5,7.25 -9.5,-7.25 ; -7.3,2 -3.3,2 -3.3,4 -7.3,4 -7.3,2
Mechanical 8:
  lines w0.1: -7.8,0 -7.3,0 ; -7.3,-0.5 -7.3,0 ; -7.3,0.5 -7.3,0 ; -6.8,0 -7.3,0 ; -5.8,-6 -5.3,-6 ; -5.8,6 -5.3,6 ; -5.3,-6.5 -5.3,-6 ; -5.3,-5.5 -5.3,-6 ; -5.3,5.5 -5.3,6 ; -5.3,6.5 -5.3,6 ; -4.8,-6 -5.3,-6 ; -4.8,6 -5.3,6 ; -0.5,0 0,0 ; 0,-0.5 0,0 ; 0,0.5 0,0 ; 0.5,0 0,0 ; 6.4,-6 6.9,-6 ; 6.4,6 6.9,6 ; 6.9,-6.5 6.9,-6 ; 6.9,-5.5 6.9,-6 ; 6.9,5.5 6.9,6 ; 6.9,6.5 6.9,6 ; 7.4,-6 6.9,-6 ; 7.4,6 6.9,6
Mechanical 14:
  lines w0.1: -5.9,0 3.6,0 7.4,-2.303 ; -5.3,-4.75 -5.3,-0.5 ccw(c-5.3,0) -5.3,0.5 -5.3,2 ; -5.3,4 -5.3,4.75 ; 6.9,-6 6.9,-2 ; 6.9,2 6.9,6 ; -9.5,-7.25 ccw(c-9,-7.25) -9,-7.75 9,-7.75 ccw(c9,-7.25) 9.5,-7.25 9.5,7.25 ccw(c9,7.25) 9,7.75 -9,7.75 ccw(c-9,7.25) -9.5,7.25 -9.5,-7.25 ; -7.3,2 -3.3,2 -3.3,4 -7.3,4 -7.3,2
3D body "REL_FINDER_36.11.stp": height 15.5, standoff -3.6, extent -9.5,-7.75 9.5,7.75

## REL_FINDER_40.52 [mm] "8 Leads, 2 Pole 16A Relay, FINDER 40.52 Series, Body 29mm x 12.4mm"
height 25
pads (8):
  round 2 hole 1.3: 11(7.5,-3.75) 12(2.53,-3.76) 14(12.5,-3.75) 21(7.5,3.75) 22(2.5,3.75) 24(12.5,3.75) A1(-12.5,-3.75) A2(-12.5,3.75)
Top Overlay:
  lines w0.2: 13.5,-4.73 13.5,-6.2 -15.5,-6.2 -15.5,6.2 13.5,6.2 13.5,4.73 ; 13.5,-2.77 13.5,2.77
Mechanical 8:
  lines w0.1: -13,-3.75 -12.5,-3.75 ; -13,3.75 -12.5,3.75 ; -12.5,-4.25 -12.5,-3.75 ; -12.5,-3.25 -12.5,-3.75 ; -12.5,3.25 -12.5,3.75 ; -12.5,4.25 -12.5,3.75 ; -12,-3.75 -12.5,-3.75 ; -12,3.75 -12.5,3.75 ; -0.5,0 0,0 ; 0,-0.5 0,0 ; 0,0.5 0,0 ; 0.5,0 0,0 ; 2,-3.75 2.5,-3.75 ; 2,3.75 2.5,3.75 ; 2.5,-4.25 2.5,-3.75 ; 2.5,-3.25 2.5,-3.75 ; 2.5,3.25 2.5,3.75 ; 2.5,4.25 2.5,3.75 ; 3,-3.75 2.5,-3.75 ; 3,3.75 2.5,3.75 ; 7,-3.75 7.5,-3.75 ; 7,3.75 7.5,3.75 ; 7.5,-4.25 7.5,-3.75 ; 7.5,-3.25 7.5,-3.75 ; 7.5,3.25 7.5,3.75 ; 7.5,4.25 7.5,3.75 ; 8,-3.75 7.5,-3.75 ; 8,3.75 7.5,3.75 ; 12,-3.75 12.5,-3.75 ; 12,3.75 12.5,3.75 ; 12.5,-4.25 12.5,-3.75 ; 12.5,-3.25 12.5,-3.75 ; 12.5,3.25 12.5,3.75 ; 12.5,4.25 12.5,3.75 ; 13,-3.75 12.5,-3.75 ; 13,3.75 12.5,3.75
Mechanical 14:
  lines w0.1: -15.5,-6.2 13.5,-6.2 13.5,6.2 -15.5,6.2 -15.5,-6.2
3D body "REL_FINDER_40.52.stp": height 25, standoff -5.3, extent -15.5,-6.2 13.5,6.2

## REL_FINDER_40.61 [mm] "8 Leads, 1 Pole 16A Relay, FINDER 40.61Series, Body 29mm x 12.4mm"
height 25
pads (8):
  round 2 hole 1.3: 11(7.5,-3.75) 12(2.53,-3.76) 14(12.5,-3.75) 21(7.5,3.75) 22(2.5,3.75) 24(12.5,3.75) A1(-12.5,-3.75) A2(-12.5,3.75)
Top Overlay:
  lines w0.2: 13.5,-4.73 13.5,-6.2 -15.5,-6.2 -15.5,6.2 13.5,6.2 13.5,4.73 ; 13.5,-2.77 13.5,2.77
Mechanical 8:
  lines w0.1: -13,-3.75 -12.5,-3.75 ; -13,3.75 -12.5,3.75 ; -12.5,-4.25 -12.5,-3.75 ; -12.5,-3.25 -12.5,-3.75 ; -12.5,3.25 -12.5,3.75 ; -12.5,4.25 -12.5,3.75 ; -12,-3.75 -12.5,-3.75 ; -12,3.75 -12.5,3.75 ; -0.5,0 0,0 ; 0,-0.5 0,0 ; 0,0.5 0,0 ; 0.5,0 0,0 ; 2,-3.75 2.5,-3.75 ; 2,3.75 2.5,3.75 ; 2.5,-4.25 2.5,-3.75 ; 2.5,-3.25 2.5,-3.75 ; 2.5,3.25 2.5,3.75 ; 2.5,4.25 2.5,3.75 ; 3,-3.75 2.5,-3.75 ; 3,3.75 2.5,3.75 ; 7,-3.75 7.5,-3.75 ; 7,3.75 7.5,3.75 ; 7.5,-4.25 7.5,-3.75 ; 7.5,-3.25 7.5,-3.75 ; 7.5,3.25 7.5,3.75 ; 7.5,4.25 7.5,3.75 ; 8,-3.75 7.5,-3.75 ; 8,3.75 7.5,3.75 ; 12,-3.75 12.5,-3.75 ; 12,3.75 12.5,3.75 ; 12.5,-4.25 12.5,-3.75 ; 12.5,-3.25 12.5,-3.75 ; 12.5,3.25 12.5,3.75 ; 12.5,4.25 12.5,3.75 ; 13,-3.75 12.5,-3.75 ; 13,3.75 12.5,3.75
Mechanical 14:
  lines w0.1: -15.5,-6.2 13.5,-6.2 13.5,6.2 -15.5,6.2 -15.5,-6.2
3D body "REL_FINDER_40.61.stp": height 25, standoff -5.3, extent -15.5,-6.2 13.5,6.2

## REL_FINDER_41.61 [mm] "8 Leads, 1 Pole 16A Relay, FINDER 41.61 Series, Body 29mm x 12.6mm"
height 15.7
pads (8):
  round 2 hole 1.3: 11(8.04,-3.75) 12(3.04,-3.75) 14(13.04,-3.75) 21(8.04,3.75) 22(3.04,3.75) 24(13.04,3.75) A1(-11.96,-3.75) A2(-11.96,3.75)
Top Overlay:
  lines w0.2: 11.5,-6.3 11.5,-4.45 cw(c12.7,-4.45) 11.646,-3.877 ; 14.348,-3.25 14.5,-3.25 ; -14.5,-6.3 14.5,-6.3 14.5,6.3 -14.5,6.3 -14.5,-6.3
Mechanical 8:
  lines w0.1: -12.46,-3.75 -11.96,-3.75 ; -12.46,3.75 -11.96,3.75 ; -11.96,-4.25 -11.96,-3.75 ; -11.96,-3.25 -11.96,-3.75 ; -11.96,3.25 -11.96,3.75 ; -11.96,4.25 -11.96,3.75 ; -11.46,-3.75 -11.96,-3.75 ; -11.46,3.75 -11.96,3.75 ; -0.5,0 0,0 ; 0,-0.5 0,0 ; 0,0.5 0,0 ; 0.5,0 0,0 ; 2.54,-3.75 3.04,-3.75 ; 2.54,3.75 3.04,3.75 ; 3.04,-4.25 3.04,-3.75 ; 3.04,-3.25 3.04,-3.75 ; 3.04,3.25 3.04,3.75 ; 3.04,4.25 3.04,3.75 ; 3.54,-3.75 3.04,-3.75 ; 3.54,3.75 3.04,3.75 ; 7.54,-3.75 8.04,-3.75 ; 7.54,3.75 8.04,3.75 ; 8.04,-4.25 8.04,-3.75 ; 8.04,-3.25 8.04,-3.75 ; 8.04,3.25 8.04,3.75 ; 8.04,4.25 8.04,3.75 ; 8.54,-3.75 8.04,-3.75 ; 8.54,3.75 8.04,3.75 ; 12.54,-3.75 13.04,-3.75 ; 12.54,3.75 13.04,3.75 ; 13.04,-4.25 13.04,-3.75 ; 13.04,-3.25 13.04,-3.75 ; 13.04,3.25 13.04,3.75 ; 13.04,4.25 13.04,3.75 ; 13.54,-3.75 13.04,-3.75 ; 13.54,3.75 13.04,3.75
Mechanical 14:
  lines w0.1: -11.96,-3.75 -11.96,-1 ; -11.96,1 -11.96,3.75 ; 2.04,-1.75 2.04,-2.75 3.04,-3.75 3.04,0 7.04,0 ; 2.04,-1.25 2.04,-0.75 ; 2.04,-0.25 2.04,0.25 ; 2.04,0.75 2.04,1.25 ; 2.04,1.75 2.04,2.75 3.04,3.75 ; 6.654,1 8.04,-2.35 8.04,-3.75 9.04,-2.75 9.04,-1.75 ; 8.04,3.75 9.04,2.75 9.04,1.75 ; 9.04,-1.25 9.04,-0.75 ; 9.04,0 13.04,0 13.04,-3.75 14.04,-2.75 14.04,-1.75 ; 9.04,0.75 9.04,1.25 ; 11.5,-6.3 11.5,-4.45 cw(c12.7,-4.45) 12.7,-3.25 14.5,-3.25 ; 13.04,3.75 14.04,2.75 14.04,1.75 ; 14.04,-1.25 14.04,-0.75 ; 14.04,-0.25 14.04,0.25 ; 14.04,0.75 14.04,1.25 ; -14.5,-6.3 14.5,-6.3 ; -14.5,-6.3 -14.5,6.3 ; -14.5,-6.3 14.5,-6.3 ; -14.5,-6.3 -14.5,6.3 ; -14.5,6.3 14.5,6.3 ; -14.5,6.3 14.5,6.3 ; 14.5,-6.3 14.5,6.3 ; 14.5,-6.3 14.5,6.3 ; -13.46,-1 -13.46,1 -10.46,1 -10.46,-1 -13.46,-1
3D body "REL_FINDER_41.61.stp": height 15.7, standoff -3.8, extent -14.5,-6.3 14.5,6.3

## REL_FINDER_50.12 [mm] "8 Leads, 2 Pole 8A Relay, FINDER 50.12 Series, Body 29mm x 12.4mm"
height 25
pads (8):
  round 2.2 hole 1.5: 11(8,-3.75) 12(3,-3.75) 14(13,-3.75) 21(8,3.75) 22(3,3.75) 24(13,3.75) A1(-12,-3.75) A2(-12,3.75)
Top Overlay:
  lines w0.2: -14.5,-6.2 14.5,-6.2 14.5,6.2 -14.5,6.2 -14.5,-6.2
Mechanical 8:
  lines w0.1: -12.5,-3.75 -12,-3.75 ; -12.5,3.75 -12,3.75 ; -12,-4.25 -12,-3.75 ; -12,-3.25 -12,-3.75 ; -12,3.25 -12,3.75 ; -12,4.25 -12,3.75 ; -11.5,-3.75 -12,-3.75 ; -11.5,3.75 -12,3.75 ; -0.5,0 0,0 ; 0,-0.5 0,0 ; 0,0.5 0,0 ; 0.5,0 0,0 ; 2.5,-3.75 3,-3.75 ; 2.5,3.75 3,3.75 ; 3,-4.25 3,-3.75 ; 3,-3.25 3,-3.75 ; 3,3.25 3,3.75 ; 3,4.25 3,3.75 ; 3.5,-3.75 3,-3.75 ; 3.5,3.75 3,3.75 ; 7.5,-3.75 8,-3.75 ; 7.5,3.75 8,3.75 ; 8,-4.25 8,-3.75 ; 8,-3.25 8,-3.75 ; 8,3.25 8,3.75 ; 8,4.25 8,3.75 ; 8.5,-3.75 8,-3.75 ; 8.5,3.75 8,3.75 ; 12.5,-3.75 13,-3.75 ; 12.5,3.75 13,3.75 ; 13,-4.25 13,-3.75 ; 13,-3.25 13,-3.75 ; 13,3.25 13,3.75 ; 13,4.25 13,3.75 ; 13.5,-3.75 13,-3.75 ; 13.5,3.75 13,3.75
Mechanical 14:
  lines w0.1: -14.5,-6.2 14.5,-6.2 14.5,6.2 -14.5,6.2 -14.5,-6.2
3D body "REL_FINDER_50.12.stp": height 25, standoff -3.8, extent -14.5,-6.2 14.5,6.2

## REL_FINDER_55.13 [mm] "11 Leads, Row Spacing 13.2mm; Body 20.7mm x 27.7mm, FINDER_55.13 Series"
height 35.8
pads (11):
  round 2.2 hole 1.5: 1(6.6,9.4) 2(0,9.4) 3(-6.6,9.4) 4(6.6,5.3) 5(0,5.3) 6(-6.6,5.3) 7(6.6,-1.05) 8(0,-1.05) 9(-6.6,-1.05) 13(6.6,-7.4) 14(-6.6,-7.4)
Top Overlay:
  lines w0.2: -6.6,3.5 -6.6,2.6 -5.2,2.6 ; -5,-1.1 -4.6,-1.1 -4.6,1.3 -3.9,3 ; -4.9,9.5 -3.3,9.5 -3.3,2.6 -3.9,2.6 ; -4.1,-7.25 -1,-7.25 ; 0,3.5 0,2.6 1.4,2.6 ; 1,-7.25 4.1,-7.25 ; 1.6,-1.1 2,-1.1 2,1.3 2.7,3 ; 1.7,9.5 3.3,9.5 3.3,2.6 2.7,2.6 ; 6.6,3.5 6.6,2.6 8,2.6 ; 8.2,-1.1 8.6,-1.1 8.6,1.3 9.3,3 ; 8.3,9.5 9.9,9.5 9.9,2.6 9.3,2.6 ; -10.35,-12.85 -10.35,12.85 -9.35,13.85 9.35,13.85 10.35,12.85 10.35,-12.85 9.35,-13.85 -9.35,-13.85 -10.35,-12.85 ; -1,-9.25 1,-9.25 1,-5.25 -1,-5.25 -1,-9.25
Mechanical 8:
  lines w0.1: -7.1,-7.4 -6.6,-7.4 ; -7.1,-1.05 -6.6,-1.05 ; -7.1,5.3 -6.6,5.3 ; -7.1,9.4 -6.6,9.4 ; -6.6,-7.9 -6.6,-7.4 ; -6.6,-6.9 -6.6,-7.4 ; -6.6,-1.55 -6.6,-1.05 ; -6.6,-0.55 -6.6,-1.05 ; -6.6,4.8 -6.6,5.3 ; -6.6,5.8 -6.6,5.3 ; -6.6,8.9 -6.6,9.4 ; -6.6,9.9 -6.6,9.4 ; -6.1,-7.4 -6.6,-7.4 ; -6.1,-1.05 -6.6,-1.05 ; -6.1,5.3 -6.6,5.3 ; -6.1,9.4 -6.6,9.4 ; -0.5,-1.05 0,-1.05 ; -0.5,0 0,0 ; -0.5,5.3 0,5.3 ; -0.5,9.4 0,9.4 ; 0,-1.55 0,-1.05 ; 0,-0.55 0,-1.05 ; 0,-0.5 0,0 ; 0,0.5 0,0 ; 0,4.8 0,5.3 ; 0,5.8 0,5.3 ; 0,8.9 0,9.4 ; 0,9.9 0,9.4 ; 0.5,-1.05 0,-1.05 ; 0.5,0 0,0 ; 0.5,5.3 0,5.3 ; 0.5,9.4 0,9.4 ; 6.1,-7.4 6.6,-7.4 ; 6.1,-1.05 6.6,-1.05 ; 6.1,5.3 6.6,5.3 ; 6.1,9.4 6.6,9.4 ; 6.6,-7.9 6.6,-7.4 ; 6.6,-6.9 6.6,-7.4 ; 6.6,-1.55 6.6,-1.05 ; 6.6,-0.55 6.6,-1.05 ; 6.6,4.8 6.6,5.3 ; 6.6,5.8 6.6,5.3 ; 6.6,8.9 6.6,9.4 ; 6.6,9.9 6.6,9.4 ; 7.1,-7.4 6.6,-7.4 ; 7.1,-1.05 6.6,-1.05 ; 7.1,5.3 6.6,5.3 ; 7.1,9.4 6.6,9.4
  text "21" at -1.5,-1.95 h1.5
  text "8" at 3,-1.55 h1.5
  text "24" at -1.5,4.05 h1.5
  text "5" at 3,4.75 h1.5
  text "22" at -1.5,8.15 h1.5
  text "2" at 3,8.95 h1.5
  text "A1" at 5.1,-8.45 h1.5
  text "11" at 5.1,-1.95 h1.5
  text "12" at 4.9,8.45 h1.5
  text "14" at 5.2,4.25 h1.5
  text "14" at -3.6,-8.45 h1.5
  text "9" at -3.6,-1.45 h1.5
  text "3" at -3.6,8.85 h1.5
  text "6" at -3.6,4.75 h1.5
  text "A2" at -8.1,-8.55 h1.5
  text "31" at -8.1,-1.95 h1.5
  text "42" at -8.1,8.15 h1.5
  text "34" at -8.1,4.05 h1.5
  text "13" at 9.6,-8.45 h1.5
  text "7" at 9.6,-1.55 h1.5
  text "1" at 9.7,9.25 h1.5
  text "4" at 9.7,4.85 h1.5
Mechanical 14:
  circle w0.1: c3.25,11.75 r2
  lines w0.1: -7.85,9.143 -2.85,9.143 ; -7.85,11.143 -2.85,11.143 ; -6.6,3.5 -6.6,2.6 -5.2,2.6 ; -5,-1.1 -4.6,-1.1 -4.6,1.3 -3.9,3 ; -4.9,9.5 -3.3,9.5 -3.3,2.6 -3.9,2.6 ; -4.1,-7.25 -1,-7.25 ; 0,3.5 0,2.6 1.4,2.6 ; 0.35,13.35 -9.143,13.35 -9.85,12.643 -9.85,-12.643 -9.143,-13.35 9.143,-13.35 9.85,-12.643 9.85,8.85 ; 0.35,13.85 0.35,11.85 ccw(c3.35,11.85) 3.35,8.85 10.35,8.85 ; 0.85,13.35 2.05,13.35 ; 0.85,13.85 0.85,11.85 ccw(c3.35,11.85) 3.35,9.35 10.35,9.35 ; 1,-7.25 4.1,-7.25 ; 1.6,-1.1 2,-1.1 2,1.3 2.7,3 ; 1.7,9.5 3.3,9.5 3.3,2.6 2.7,2.6 ; 4.45,10.15 6.346,10.15 6.831,10.5 ; 4.45,13.35 6.346,13.35 ; 4.811,10.5 8.85,10.5 10.35,11.75 8.85,13 4.811,13 ; 6.6,3.5 6.6,2.6 8,2.6 ; 6.831,13 6.346,13.35 ; 8.2,-1.1 8.6,-1.1 8.6,1.3 9.3,3 ; 8.3,9.5 9.9,9.5 9.9,2.6 9.3,2.6 ; 9.85,9.35 9.85,11.333 ; 9.85,12.167 9.85,12.643 9.143,13.35 6.346,13.35 ; -10.35,-12.85 -10.35,12.85 -9.35,13.85 9.35,13.85 10.35,12.85 10.35,-12.85 9.35,-13.85 -9.35,-13.85 -10.35,-12.85 ; -7.85,-11.343 -4.85,-11.343 -4.85,-8.343 -7.85,-8.343 -7.85,-11.343 ; -7.85,8.643 -2.85,8.643 -2.85,11.643 -7.85,11.643 -7.85,8.643 ; -1,-9.25 -1,-5.25 1,-5.25 1,-9.25 -1,-9.25 ; 1.641,11.402 2.902,11.402 2.902,10.153 3.588,10.153 3.588,11.402 4.71,11.402 4.71,12.088 3.588,12.088 3.588,13.222 2.902,13.222 2.902,12.088 1.641,12.088 1.641,11.402 ; 5.104,11 6.075,11.75 5.104,12.5 8.669,12.5 9.569,11.75 8.669,11 5.104,11
3D body "REL_FINDER_55.13.stp": height 36.3, standoff -3.8, extent -10.35,-13.85 10.35,13.85